# Altium footprint library connectors.PCBLIB: 188 footprints (part 2 of 12)
Each footprint in its own frame and in the unit in brackets; x right, y up, seen from the top. Pads: shape width x height; smd on the part's side, far side on the other; paste and mask are expansions set on the pad; w line width, h text height; cw(c..) or ccw(c..) is an arc to the next point about the centre after c.
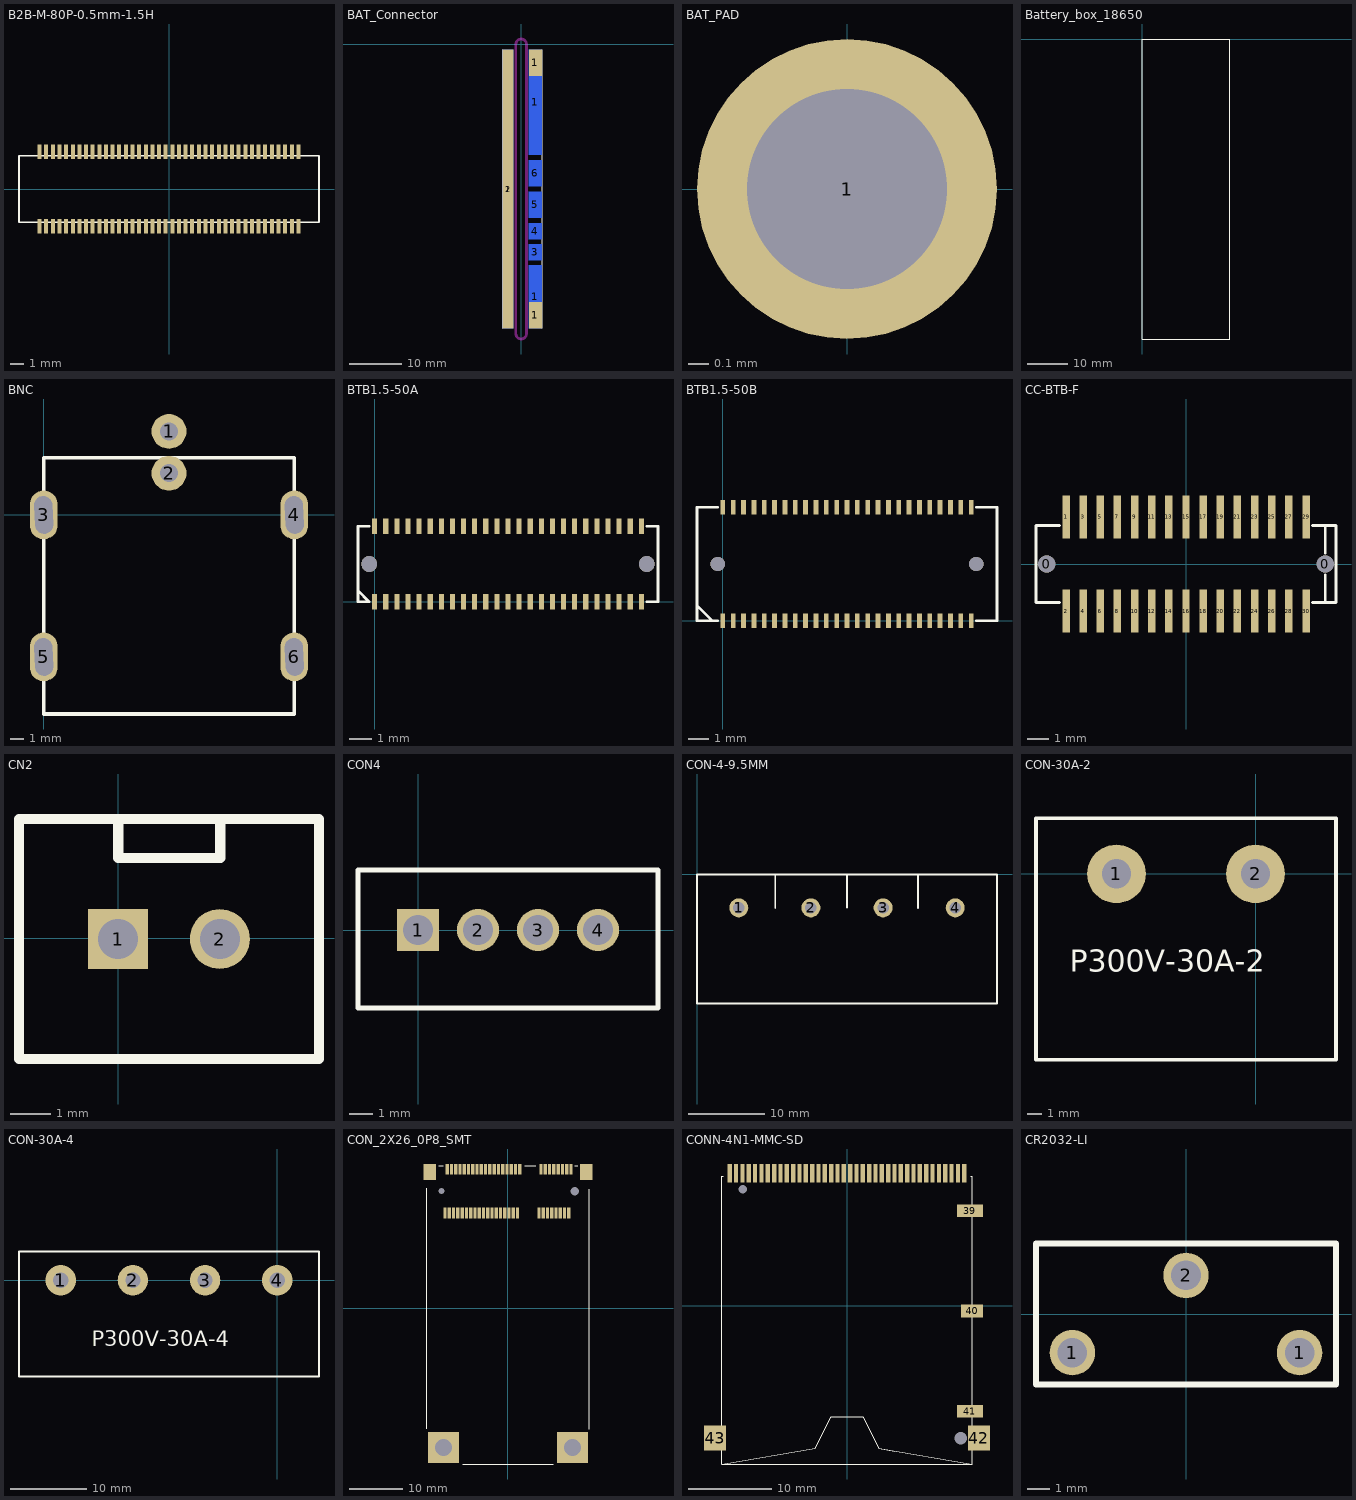
[diagram p1: the footprints below, top view; thin cyan lines are the x and y axes]

## B2B-M-80P-0.5mm-1.5H [mm]
pads (80):
  rect 0.3x1.1 smd: 1(-9.75,-2.8) 2(-9.75,2.8) 3(-9.25,-2.8) 4(-9.25,2.8) 5(-8.75,-2.8) 6(-8.75,2.8) 7(-8.25,-2.8) 8(-8.25,2.8) 9(-7.75,-2.8) 10(-7.75,2.8) 11(-7.25,-2.8) 12(-7.25,2.8) 13(-6.75,-2.8) 14(-6.75,2.8) 15(-6.25,-2.8) 16(-6.25,2.8) 17(-5.75,-2.8) 18(-5.75,2.8) 19(-5.25,-2.8) 20(-5.25,2.8) 21(-4.75,-2.8) 22(-4.75,2.8) 23(-4.25,-2.8) 24(-4.25,2.8) 25(-3.75,-2.8) 26(-3.75,2.8) 27(-3.25,-2.8) 28(-3.25,2.8) 29(-2.75,-2.8) 30(-2.75,2.8) 31(-2.25,-2.8) 32(-2.25,2.8) 33(-1.75,-2.8) 34(-1.75,2.8) 35(-1.25,-2.8) 36(-1.25,2.8) 37(-0.75,-2.8) 38(-0.75,2.8) 39(-0.25,-2.8) 40(-0.25,2.8) 41(0.25,-2.8) 42(0.25,2.8) 43(0.75,-2.8) 44(0.75,2.8) 45(1.25,-2.8) 46(1.25,2.8) 47(1.75,-2.8) 48(1.75,2.8) 49(2.25,-2.8) 50(2.25,2.8) 51(2.75,-2.8) 52(2.75,2.8) 53(3.25,-2.8) 54(3.25,2.8) 55(3.75,-2.8) 56(3.75,2.8) 57(4.25,-2.8) 58(4.25,2.8) 59(4.75,-2.8) 60(4.75,2.8) 61(5.25,-2.8) 62(5.25,2.8) 63(5.75,-2.8) 64(5.75,2.8) 65(6.25,-2.8) 66(6.25,2.8) 67(6.75,-2.8) 68(6.75,2.8) 69(7.25,-2.8) 70(7.25,2.8) 71(7.75,-2.8) 72(7.75,2.8) 73(8.25,-2.8) 74(8.25,2.8) 75(8.75,-2.8) 76(8.75,2.8) 77(9.25,-2.8) 78(9.25,2.8) 79(9.75,-2.8) 80(9.75,2.8)
Top Overlay:
  lines w0.127: -11.3,-2.5 11.3,-2.5 11.3,2.5 -11.3,2.5 -11.3,-2.5

## BAT_Connector [mm]
pads (10):
  rect 2x53 smd far side: 1(-2.5,-27.5)
  rect 2.5x5 smd: 1(2.7,-51.5) 1(2.7,-3.5)
  rect 2.5x12 smd far side: 1(2.7,-48)
  rect 2.5x20 smd far side: 1(2.7,-11)
  rect 2x53 smd: 2(-2.5,-27.5)
  rect 2.5x3 smd far side: 3(2.7,-39.5) 4(2.7,-35.5)
  rect 2.5x5 smd far side: 5(2.7,-30.5) 6(2.7,-24.5)
Top Overlay:
  lines w0.152: -3.5,-54 -3.5,-1 ; 4,-54 4,-1
Keep-Out Layer:
  lines w0.508: -1,-55 ccw(c0,-55) 1,-55 1,0 ccw(c0,0) -1,0 -1,-55

## BAT_PAD [mm]
pads (1):
  round 1.5 hole 1: 1(0,0)

## Battery_box_18650 [mm]
Top Overlay:
  lines w0.203: 0,-75 22,-75 22,0 0,0 0,-75

## BNC [mm]
pads (6):
  round 2.5 hole 1.3: 1(9,6) 2(9,3)
  oval 2x3.5 hole 1.3 slot 2.7 at 92.5 deg: 3(0,0) 4(18,0) 5(0,-10.2) 6(18,-10.2)
Top Overlay:
  lines w0.254: 0,4.1 0,4.1 ; 0,4.1 0,-14.3 18,-14.3 18,4.1 0,4.1

## BTB1.5-50A [mm]
pads (50):
  rect 0.23x0.7 smd: 1(0,0) 2(0,3.4) 3(0.5,0) 4(0.5,3.4) 5(1,0) 6(1,3.4) 7(1.5,0) 8(1.5,3.4) 9(2,0) 10(2,3.4) 11(2.5,0) 12(2.5,3.4) 13(3,0) 14(3,3.4) 15(3.5,0) 16(3.5,3.4) 17(4,0) 18(4,3.4) 19(4.5,0) 20(4.5,3.4) 21(5,0) 22(5,3.4) 23(5.5,0) 24(5.5,3.4) 25(6,0) 26(6,3.4) 27(6.5,0) 28(6.5,3.4) 29(7,0) 30(7,3.4) 31(7.5,0) 32(7.5,3.4) 33(8,0) 34(8,3.4) 35(8.5,0) 36(8.5,3.4) 37(9,0) 38(9,3.4) 39(9.5,0) 40(9.5,3.4) 41(10,0) 42(10,3.4) 43(10.5,0) 44(10.5,3.4) 45(11,0) 46(11,3.4) 47(11.5,0) 48(11.5,3.4) 49(12,0) 50(12,3.4)
via 12.25,1.7 diameter 0.7 hole 0.7
via -0.25,1.7 diameter 0.7 hole 0.7
Top Overlay:
  lines w0.127: -0.75,0.5 -0.25,0 ; -0.25,3.4 -0.75,3.4 -0.75,0 -0.25,0 ; 12.25,0 12.75,0 12.75,3.4 12.25,3.4 ; -0.25,0 -0.25,0 ; -0.5,0 -0.5,0

## BTB1.5-50B [mm]
pads (50):
  rect 0.23x0.7 smd: 1(0,0) 2(0,5.5) 3(0.5,0) 4(0.5,5.5) 5(1,0) 6(1,5.5) 7(1.5,0) 8(1.5,5.5) 9(2,0) 10(2,5.5) 11(2.5,0) 12(2.5,5.5) 13(3,0) 14(3,5.5) 15(3.5,0) 16(3.5,5.5) 17(4,0) 18(4,5.5) 19(4.5,0) 20(4.5,5.5) 21(5,0) 22(5,5.5) 23(5.5,0) 24(5.5,5.5) 25(6,0) 26(6,5.5) 27(6.5,0) 28(6.5,5.5) 29(7,0) 30(7,5.5) 31(7.5,0) 32(7.5,5.5) 33(8,0) 34(8,5.5) 35(8.5,0) 36(8.5,5.5) 37(9,0) 38(9,5.5) 39(9.5,0) 40(9.5,5.5) 41(10,0) 42(10,5.5) 43(10.5,0) 44(10.5,5.5) 45(11,0) 46(11,5.5) 47(11.5,0) 48(11.5,5.5) 49(12,0) 50(12,5.5)
via -0.25,2.75 diameter 0.7 hole 0.7
via 12.25,2.75 diameter 0.7 hole 0.7
Top Overlay:
  lines w0.127: -1.25,0.75 -0.5,0 ; -0.25,0 -1.25,0 -1.25,5.5 -0.25,5.5 ; 12.25,0 13.25,0 13.25,5.5 12.25,5.5

## CC-BTB-F [mm]
pads (32):
  round 0.8 hole 0.8: 0(-6.5,0) 0(6.5,0)
  rect 0.35x2 smd: 1(-5.6,2.2) 2(-5.6,-2.2) 3(-4.8,2.2) 4(-4.8,-2.2) 5(-4,2.2) 6(-4,-2.2) 7(-3.2,2.2) 8(-3.2,-2.2) 9(-2.4,2.2) 10(-2.4,-2.2) 11(-1.6,2.2) 12(-1.6,-2.2) 13(-0.8,2.2) 14(-0.8,-2.2) 15(0,2.2) 16(0,-2.2) 17(0.8,2.2) 18(0.8,-2.2) 19(1.6,2.2) 20(1.6,-2.2) 21(2.4,2.2) 22(2.4,-2.2) 23(3.2,2.2) 24(3.2,-2.2) 25(4,2.2) 26(4,-2.2) 27(4.8,2.2) 28(4.8,-2.2) 29(5.6,2.2) 30(5.6,-2.2)
Top Overlay:
  lines w0.127: -5.9,-1.8 -7,-1.8 -7,1.8 -5.9,1.8 ; 5.9,-1.8 7,-1.8 7,1.8 5.9,1.8 ; 6.5,-1.8 6.5,-0.5 ; 6.5,0.5 6.5,1.8

## CN2 [mm]
pads (2):
  rect 1.5x1.5 hole 1: 1(-0.001,-0.018)
  round 1.5 hole 1: 2(2.539,-0.018)
Top Overlay:
  lines w0.254: -0.001,2.882 -0.001,2.007 2.549,2.007 2.549,2.982 ; -2.481,-3.018 5.019,-3.018 5.019,2.982 -2.481,2.982 -2.481,-3.018

## CON4 [mil] "Connector; Header; 4 Position"
height 270.08
pads (4):
  rect 70x70 hole 50: 1(0,0)
  round 70 hole 50: 2(100,0) 3(200,0) 4(300,0)
Top Overlay:
  lines w7.87: -100,-130 -100,0 -100,100 400,100 400,-130 -100,-130

## CON-4-9.5MM [mm]
pads (4):
  round 2.5 hole 1.5: 1(5.5,-4.4) 2(15,-4.4) 3(24.5,-4.4) 4(34,-4.4)
Top Overlay:
  lines w0.254: 10.3,-4.4 10.3,0 ; 19.75,-4.35 19.75,0 ; 29.1,-4.4 29.1,0 ; 0,-17 39.5,-17 39.5,0 0,0 0,-17

## CON-30A-2 [mm]
pads (2):
  round 4 hole 2: 1(-9.5,0) 2(0,0)
Top Overlay:
  lines w0.254: -15,-12.7 -15,3.8 5.5,3.8 5.5,-12.7 -15,-12.7
  text "P300V-30A-2" at -12.7,-6.7 h1.5

## CON-30A-4 [mm]
pads (4):
  round 4 hole 2: 1(-28.5,0) 2(-19,0) 3(-9.5,0) 4(0,0)
Top Overlay:
  lines w0.254: -34,-12.7 5.5,-12.7 5.5,3.8 -34,3.8 -34,-12.7
  text "P300V-30A-4" at -24.4,-8.7 h2

## CON_2X26_0P8_SMT [mil] "CON_2X26_0P8_SMT"
pads (58):
  rect 24x79 smd: 1(464.57,1026.58) 2(448.82,703.74) 3(433.07,1026.58) 4(417.32,703.74) 5(401.57,1026.58) 6(385.83,703.74) 7(370.08,1026.58) 8(354.33,703.74) 9(338.58,1026.58) 10(322.83,703.74) 11(307.09,1026.58) 12(291.34,703.74) 13(275.59,1026.58) 14(259.84,703.74) 15(244.09,1026.58) 16(228.35,703.74) 17(86.61,1026.58) 18(70.87,703.74) 19(55.12,1026.58) 20(39.37,703.74) 21(23.62,1026.58) 22(7.87,703.74) 23(-7.87,1026.58) 24(-23.62,703.74) 25(-39.37,1026.58) 26(-55.12,703.74) 27(-70.87,1026.58) 28(-86.61,703.74) 29(-102.36,1026.58) 30(-118.11,703.74) 31(-133.86,1026.58) 32(-149.61,703.74) 33(-165.35,1026.58) 34(-181.1,703.74) 35(-196.85,1026.58) 36(-212.6,703.74) 37(-228.35,1026.58) 38(-244.09,703.74) 39(-259.84,1026.58) 40(-275.59,703.74) 41(-291.34,1026.58) 42(-307.09,703.74) 43(-322.83,1026.58) 44(-338.58,703.74) 45(-354.33,1026.58) 46(-370.08,703.74) 47(-385.83,1026.58) 48(-401.57,703.74) 49(-417.32,1026.58) 50(-433.07,703.74) 51(-448.82,1026.58) 52(-464.57,703.74)
  round 10 hole 44: " "(-492.13,865.15)
  rect 228x228 hole 126: " "(-476.38,-1026.58) " "(476.38,-1026.58)
  round 10 hole 63: " "(492.13,865.15)
  rect 91x118.11 smd: " "(576.77,1006.89) ""(-576.77,1006.89)
Top Overlay:
  lines w5: -598.51,-889.29 -598.51,886.33 ; -509.76,1052.74 -476.23,1052.74 ; -335.05,-1148.21 334.31,-1148.21 ; 125.06,1052.73 203.22,1052.73 ; 492.14,1052.23 516.59,1052.23 ; 598.53,-891.07 598.53,879.27 ; 203.22,1052.73 203.22,1052.74

## CONN-4N1-MMC-SD [mm] "CONN-6N1-MMC-SD"
pads (45):
  rect 0.51x2.2 smd: 1(-14.06,15.89) 2(-13.3,15.89) 3(-12.54,15.89) 4(-11.78,15.89) 5(-11.02,15.89) 6(-10.26,15.89) 7(-9.5,15.89) 8(-8.74,15.89) 9(-7.98,15.89) 10(-7.22,15.89) 11(-6.46,15.89) 12(-5.7,15.89) 13(-4.94,15.89) 14(-4.18,15.89) 15(-3.42,15.89) 16(-2.66,15.89) 17(-1.9,15.89) 18(-1.14,15.89) 19(-0.38,15.89) 20(0.38,15.89) 21(1.14,15.89) 22(1.9,15.89) 23(2.66,15.89) 24(3.42,15.89) 25(4.18,15.89) 26(4.94,15.89) 27(5.7,15.89) 28(6.46,15.89) 29(7.22,15.89) 30(7.98,15.89) 31(8.74,15.89) 32(9.5,15.89) 33(10.26,15.89) 34(11.02,15.89) 35(11.78,15.89) 36(12.54,15.89) 37(13.3,15.89) 38(14.06,15.89)
  rect 3.1x1.5 smd: 39(14.75,11.41) 41(14.75,-12.69)
  rect 2.6x1.5 smd: 40(15,-0.64)
  rect 2.65x3 smd: 42(15.825,-15.89) 43(-15.825,-15.89)
  round 0.9 hole 1: ""(-12.5,13.96)
  round 1.4 hole 1.5: ""(13.65,-15.89)
Top Overlay:
  lines w0.127: -14.82,15.51 -15,15.51 -15,-18.99 ; 5.7,-17.48 3.8,-17.1 ; 14.82,15.51 15,15.51 15,-18.99 ; -15,-18.99 -3.8,-17.1 -1.9,-13.3 1.9,-13.3 3.8,-17.1 ; -15,-18.99 15,-18.99 ; 3.8,-17.1 15,-18.99

## CR2032-LI [mm]
pads (3):
  round 2 hole 1.3: 1(-5,-1.7) 1(5,-1.7) 2(0,1.7)
Top Overlay:
  lines w0.254: -6.6,-3.1 6.6,-3.1 6.6,3.1 -6.6,3.1 -6.6,-3.1